# Altium footprint library BRT_Components.PcbLib: 132 footprints (part 5 of 9)
Each footprint in its own frame and in the unit in brackets; x right, y up, seen from the top. Pads: shape width x height; smd on the part's side, far side on the other; paste and mask are expansions set on the pad; w line width, h text height; cw(c..) or ccw(c..) is an arc to the next point about the centre after c.
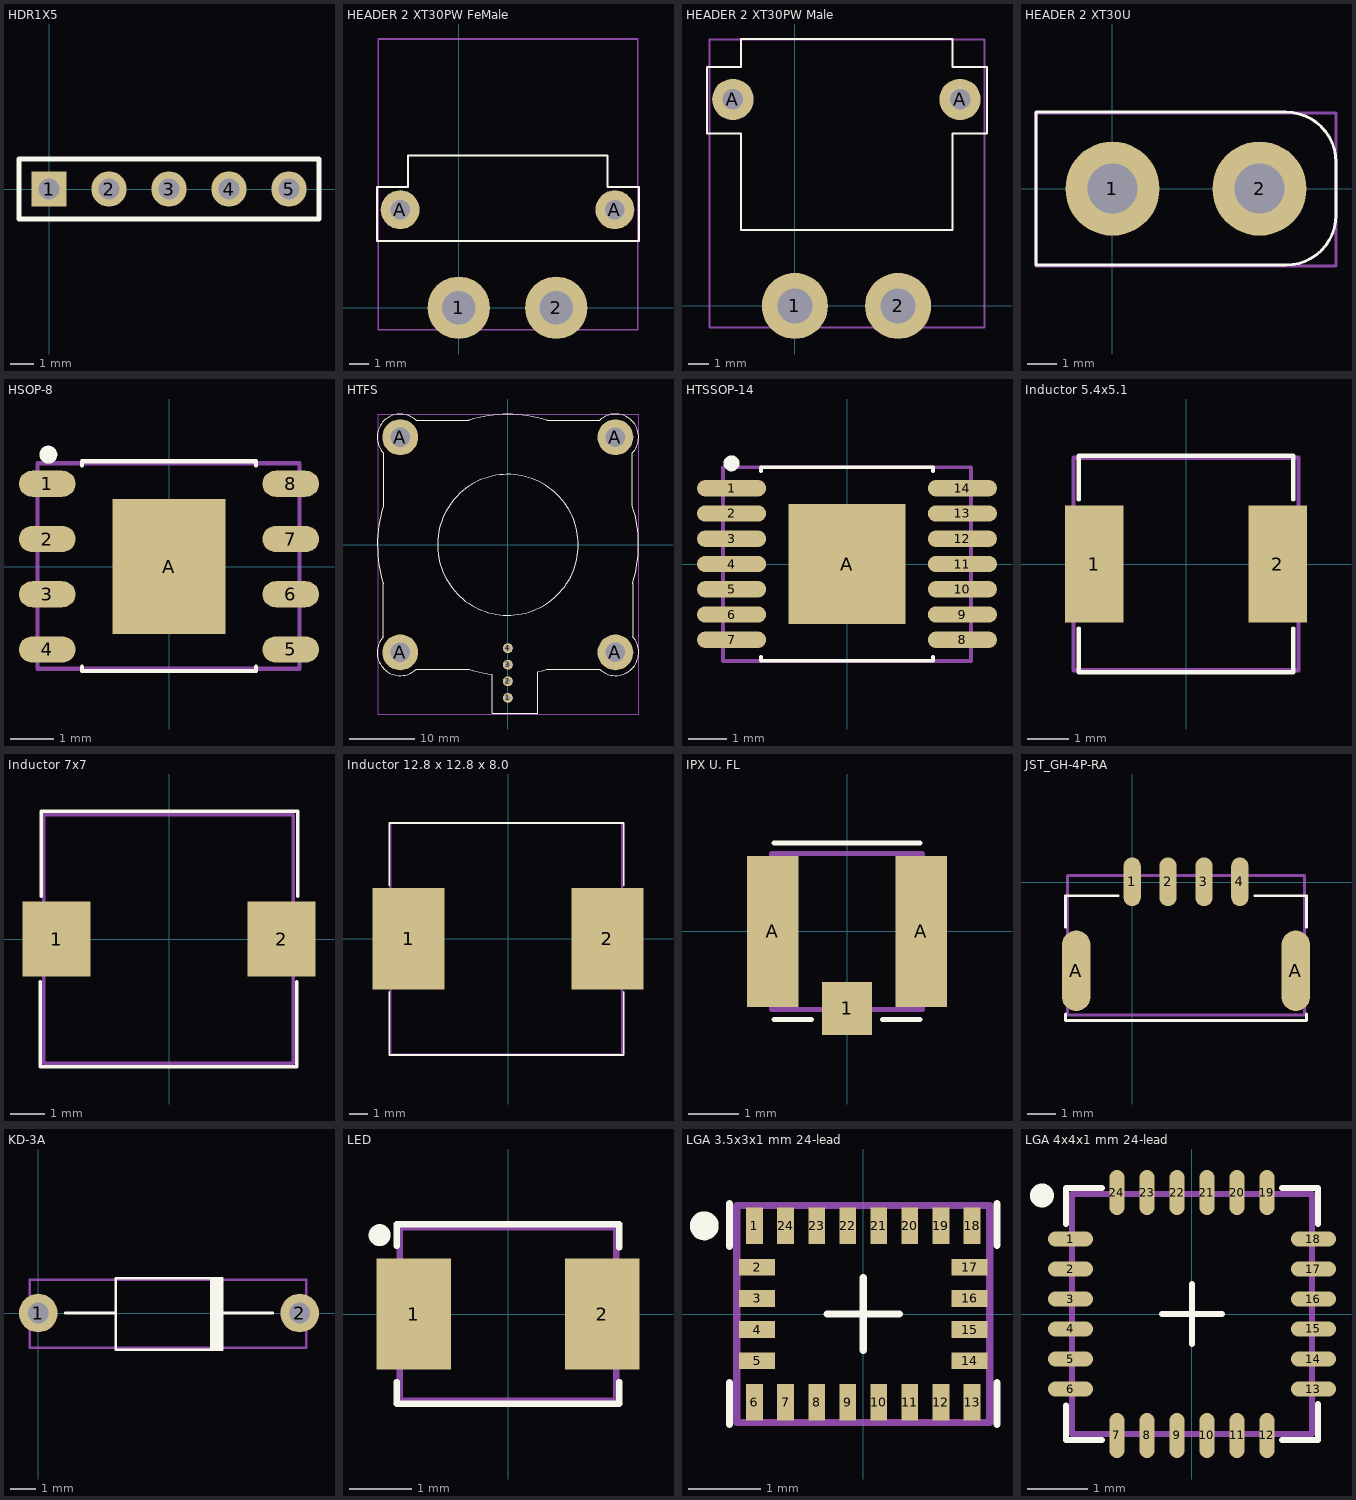
[diagram p4: the footprints below, top view; thin cyan lines are the x and y axes]

## HDR1X5 [mm] "Connector; Header; 5 Position"
pads (5):
  rect 1.5x1.5 hole 0.9: 1(0,0)
  round 1.5 hole 0.9: 2(2.54,0) 3(5.08,0) 4(7.62,0) 5(10.16,0)
Top Overlay:
  lines w0.2: -1.27,-1.27 -1.27,1.27 11.43,1.27 11.43,-1.27 -1.27,-1.27

## HEADER 2 XT30PW FeMale [mm]
pads (4):
  round 3.2 hole 1.7: 1(0,0) 2(5,0)
  round 2 hole 1: A(-3,5.025) A(8,5.025)
Top Overlay:
  lines w0.1: -4.2,3.425 9.25,3.425 9.25,6.2 7.625,6.2 7.625,7.8 -2.6,7.8 -2.6,6.2 -4.2,6.2 -4.2,3.425
Mechanical 13:
  lines w0.1: -4.125,-1.125 9.175,-1.125 9.175,13.775 -4.125,13.775 -4.125,-1.125
3D body "User Library-XT30PW-F.step": height 5, standoff -2, extent -4.1,-1.125 9.2,13.775

## HEADER 2 XT30PW Male [mm]
pads (4):
  round 3.2 hole 1.7: 1(0,0) 2(5,0)
  round 2 hole 1: A(-3,10) A(8,10)
Top Overlay:
  lines w0.1: -4.25,8.35 -2.6,8.35 -2.6,3.675 7.625,3.675 7.625,8.35 9.3,8.35 9.3,11.575 7.625,11.575 7.625,12.925 -2.6,12.925 -2.6,11.575 -4.25,11.575 -4.25,8.35
Mechanical 13:
  lines w0.1: -4.125,-1.05 9.175,-1.05 9.175,12.9 -4.125,12.9 -4.125,-1.05
3D body "User Library-XT30PW-M.step": height 5.1, standoff -1.9, extent -4.125,-1.05 9.175,12.9

## HEADER 2 XT30U [mm]
pads (2):
  round 3.2 hole 1.7: 1(0,0) 2(5,0)
Top Overlay:
  lines w0.1: -2.6,-2.6 5.9,-2.6 ccw(c5.9,-0.9) 7.6,-0.9 7.6,0.9 ccw(c5.9,0.9) 5.9,2.6 -2.6,2.6 -2.6,-2.6
Mechanical 13:
  lines w0.1: -2.6,-2.625 -2.6,2.575 7.6,2.575 7.6,-2.625 -2.6,-2.625
3D body "User Library-XT30UPB-F-1.step": height 9.5, standoff -1.9, extent -2.6,-2.625 7.6,2.575

## HSOP-8 [mm]
height 2.65
pads (9):
  oval 1.3x0.6 smd mask+0.03: 1(-2.8,1.905) 2(-2.8,0.635) 3(-2.8,-0.635) 4(-2.8,-1.905) 5(2.8,-1.905) 6(2.8,-0.635) 7(2.8,0.635) 8(2.8,1.905)
  rect 2.6x3.1 smd mask+0.03: A(0,0)
Top Overlay:
  circle w0.21: c-2.775,2.575 r0.1
  lines w0.1: -2,-2.3 -2,-2.4 2,-2.4 2,-2.3 ; -2,2.325 -2,2.425 2,2.425 2,2.325
Mechanical 13:
  lines w0.1: -3.025,-2.35 3,-2.35 3,2.375 -3.025,2.375 -3.025,-2.35
3D body "User Library-HSOP-8-DDA.step": height 1.7, standoff 0, extent -3.014,-2.346 3.014,2.346

## HTFS [mm]
pads (8):
  round 1.524 hole 0.8: 1(0,-23.475) 2(0,-20.935) 3(0,-18.395) 4(0,-15.855)
  round 5.5 hole 3: A(-16.5,-16.5) A(-16.5,16.5) A(16.5,-16.5) A(16.5,16.5)
Top Overlay:
  circle w0.1: c0.013,-0.001 r10.8
  lines w0.1: -19.101,14.083 cw(c-16.5,16.5) -14.083,19.101 ; -19.1,14.079 -19.1,5.95 ccw(c0.013,-0.001) -19.088,-5.99 ; -19.089,-14.097 ccw(c-16.488,-16.514) -14.072,-19.115 ; -19.088,-14.093 -19.088,-5.964 ; -14.079,19.1 -5.95,19.1 ; -14.067,-19.114 -5.938,-19.114 ccw(c0.013,-0.001) -2.4,-19.873 -2.4,-25.85 4.6,-25.85 4.6,-19.61 4.6,-19.486 ccw(c0.013,-0.001) 6.001,-19.102 ; -5.976,19.1 cw(c0.013,-0.001) 5.964,19.112 14.093,19.112 ; 5.976,-19.102 14.104,-19.102 ; 14.098,19.112 cw(c16.514,16.512) 19.115,14.095 ; 14.109,-19.103 ccw(c16.526,-16.502) 19.126,-14.086 ; 19.114,5.962 19.114,14.09 ; 19.114,5.987 cw(c0.013,-0.001) 19.126,-5.952 19.126,-14.081
Mechanical 13:
  lines w0.1: -19.9,-25.95 -19.9,20.05 20.1,20.05 20.1,-25.95 -19.9,-25.95
3D body "User Library-HTFS 800-P-1.step": height 17.3, standoff -3.2, extent -19.9,-25.95 20.1,20.05

## HTSSOP-14 [mm]
height 2.65
pads (15):
  oval 1.78x0.42 smd mask+0.03: 1(-2.97,1.95) 2(-2.97,1.3) 3(-2.97,0.65) 4(-2.97,0) 5(-2.97,-0.65) 6(-2.97,-1.3) 7(-2.97,-1.95) 8(2.97,-1.95) 9(2.97,-1.3) 10(2.97,-0.65) 11(2.97,0) 12(2.97,0.65) 13(2.97,1.3) 14(2.97,1.95)
  rect 3x3.1 smd mask+0.03: A(0,0)
Top Overlay:
  circle w0.21: c-2.972,2.591 r0.1
  lines w0.1: -2.21,-2.388 -2.21,-2.489 -1.803,-2.489 2.21,-2.489 2.21,-2.388 ; -2.21,2.388 -2.21,2.489 -1.803,2.489 2.21,2.489 2.21,2.388
Mechanical 13:
  lines w0.1: -3.191,-2.491 -3.191,2.491 3.191,2.491 3.191,-2.491 -3.191,-2.491
3D body "User Library-HTSSOP14.step": height 1.1, standoff 0, extent -3.191,-2.491 3.191,2.491

## Inductor 5.4x5.1 [mm]
pads (2):
  rect 1.4x2.8 smd: 1(-2.2,0) 2(2.2,0)
Top Overlay:
  lines w0.1: -2.575,-1.55 -2.575,-2.6 2.575,-2.6 2.575,-1.55 ; -2.575,1.55 -2.575,2.6 2.575,2.6 2.575,1.55
Mechanical 13:
  lines w0.1: -2.7,-2.55 -2.7,2.55 2.7,2.55 2.7,-2.55 -2.7,-2.55
3D body "User Library-SPM5020-LR.step": height 2, standoff 0, extent -2.7,-2.55 2.7,2.55

## Inductor 7x7 [mm]
pads (2):
  rect 2x2.2 smd: 1(-3.3,0) 2(3.3,0)
Top Overlay:
  lines w0.1: -3.775,-1.25 -3.775,-3.75 3.75,-3.75 3.75,-1.25 ; -3.75,1.25 -3.75,3.75 3.775,3.75 3.775,1.25
Mechanical 13:
  lines w0.1: -3.675,-3.65 3.65,-3.65 3.65,3.65 -3.675,3.65 -3.675,-3.65
3D body "User Library-DE0704.step": height 4.5, standoff 0, extent -3.65,-3.65 3.65,3.65

## Inductor 12.8 x 12.8 x 8.0 [mm]
pads (2):
  rect 4x5.6 smd: 1(-5.5,0) 2(5.5,0)
Top Overlay:
  lines w0.1: -6.575,-2.95 -6.575,-6.425 6.3,-6.425 6.4,-6.425 6.4,-2.95 ; -6.575,2.95 -6.575,6.4 ; 6.4,2.95 6.4,6.4 6.3,6.4 -6.575,6.4 ; -6.575,6.4 -6.575,6.4
Mechanical 13:
  lines w0.1: -6.5,-6.4 6.3,-6.4 6.3,6.4 -6.5,6.4 -6.5,-6.4
3D body "User Library-b82477g4.step": height 8, standoff 0, extent -6.5,-6.4 6.3,6.4

## IPX U. FL [mm]
pads (3):
  rect 1x1.05 smd: 1(0,-1.525)
  rect 1.025x3 smd: A(-1.475,0) A(1.475,0)
Top Overlay:
  lines w0.1: -1.45,-1.75 -0.7,-1.75 ; -1.45,1.75 -0.7,1.75 1.45,1.75 ; 0.7,-1.75 1.45,-1.75
Mechanical 13:
  lines w0.1: -1.5,-1.55 -1.5,1.55 1.5,1.55 1.5,-1.55 -1.5,-1.55
3D body "ipex_pcb.step": height 1.25, standoff 0, extent -1.5,-1.55 1.5,1.55

## JST_GH-4P-RA [mm]
pads (6):
  rrect100% 0.6x1.7 smd: 1(0,0.01) 2(1.25,0.01) 3(2.5,0.01) 4(3.75,0.01)
  rrect100% 1x2.8 smd: A(-1.95,-3.09) A(5.7,-3.09)
Top Overlay:
  lines w0.1: -2.325,-4.6 -2.325,-4.825 6.075,-4.825 6.075,-4.6 ; -2.325,-1.575 -2.325,-0.475 -0.5,-0.475 ; 4.275,-0.475 6.075,-0.475 6.075,-1.575
Mechanical 13:
  lines w0.102: -2.25,-4.625 -2.25,0.225 6,0.225 6,-4.625 -2.25,-4.625
3D body "JST SM04B-GHS-TB.STEP": height 4.35, standoff 0, extent -2.25,-4.625 6,0.225

## KD-3A [mm]
pads (2):
  round 1.5 hole 0.8: 1(0,0) 2(10.15,0)
Top Overlay:
  rectangle: 6.675,-1.425 7.15,1.35
  lines w0.1: 1.05,0 3,0 ; 7.15,0 9.1,0 ; 3,-1.425 3,1.35 7.15,1.35 7.15,-1.425 3,-1.425
Mechanical 13:
  lines w0.1: -0.325,-1.35 -0.325,1.3 10.4,1.3 10.4,-1.35 -0.325,-1.35
3D body "User Library-Silicone Diode 3_9x2_6.step": height 3.03, standoff -1.08, extent -0.31,-1.35 10.41,1.3

## LED [mm]
pads (2):
  rect 1.2x1.8 smd: 1(-1.525,0) 2(1.525,0)
Top Overlay:
  circle w0.254: c-2.075,1.275 r0.05
  lines w0.1: -1.8,-1.1 -1.8,-1.45 1.8,-1.45 1.8,-1.1 ; -1.8,1.1 -1.8,1.45 1.8,1.45 1.8,1.075
Mechanical 13:
  lines w0.1: -1.75,-1.4 -1.75,1.4 1.75,1.4 1.75,-1.4 -1.75,-1.4
3D body "SMD LED ASMT-UWB1-NX302.SLDPRT": height 1.9, standoff 0.05, extent -1.75,-1.4 1.75,1.4

## LGA 3.5x3x1 mm 24-lead [mm]
pads (24):
  rect 0.23x0.5 smd mask+0.025: 1(-1.505,1.22) 6(-1.505,-1.22) 7(-1.075,-1.22) 8(-0.645,-1.22) 9(-0.215,-1.22) 10(0.215,-1.22) 11(0.645,-1.22) 12(1.075,-1.22) 13(1.505,-1.22) 18(1.505,1.22) 19(1.075,1.22) 20(0.645,1.22) 21(0.215,1.22) 22(-0.215,1.22) 23(-0.645,1.22) 24(-1.075,1.22)
  rect 0.5x0.23 smd mask+0.025: 2(-1.47,0.645) 3(-1.47,0.215) 4(-1.47,-0.215) 5(-1.47,-0.645) 14(1.47,-0.645) 15(1.47,-0.215) 16(1.47,0.215) 17(1.47,0.645)
Top Overlay:
  circle w0.2: c-2.2,1.22 r0.1
  lines w0.1: -1.85,-1.525 -1.85,-0.95 ; -1.85,0.935 -1.85,1.525 ; -0.5,0 0.5,0 ; 0,-0.5 0,0.5 ; 1.85,-1.525 1.85,-0.95 ; 1.85,0.95 1.85,1.525
Mechanical 13:
  lines w0.1: -1.75,-1.5 -1.75,1.5 1.75,1.5 1.75,-1.5 -1.75,-1.5
3D body "User Library-LGA-24L_3_5x3_0_43p.step": height 1, standoff 0, extent -1.75,-1.5 1.75,1.5

## LGA 4x4x1 mm 24-lead [mm]
pads (24):
  oval 0.75x0.25 smd mask+0.045: 1(-2.025,1.25) 2(-2.025,0.75) 3(-2.025,0.25) 4(-2.025,-0.25) 5(-2.025,-0.75) 6(-2.025,-1.25) 13(2.025,-1.25) 14(2.025,-0.75) 15(2.025,-0.25) 16(2.025,0.25) 17(2.025,0.75) 18(2.025,1.25)
  oval 0.25x0.75 smd mask+0.045: 7(-1.25,-2.025) 8(-0.75,-2.025) 9(-0.25,-2.025) 10(0.25,-2.025) 11(0.75,-2.025) 12(1.25,-2.025) 19(1.25,2.025) 20(0.75,2.025) 21(0.25,2.025) 22(-0.25,2.025) 23(-0.75,2.025) 24(-1.25,2.025)
Top Overlay:
  circle w0.2: c-2.5,1.975 r0.1
  lines w0.1: -2.1,-1.525 -2.1,-2.1 -1.5,-2.1 ; -2.1,1.5 -2.1,2.1 -1.5,2.1 ; -0.5,0 0.5,0 ; 0,-0.5 0,0.5 ; 1.5,-2.1 2.1,-2.1 2.1,-1.5 ; 1.5,2.1 2.1,2.1 2.1,1.5
Mechanical 13:
  lines w0.1: -2,-2 -2,2 2,2 2,-2 -2,-2
3D body "LGA 4x4x1.step": height 1.08, standoff 0, extent -2,-2 2,2